# Altium footprint library MyComponents_v2.5.PcbLib: 403 footprints (part 20 of 26)
Each footprint in its own frame and in the unit in brackets; x right, y up, seen from the top. Pads: shape width x height; smd on the part's side, far side on the other; paste and mask are expansions set on the pad; w line width, h text height; cw(c..) or ccw(c..) is an arc to the next point about the centre after c.
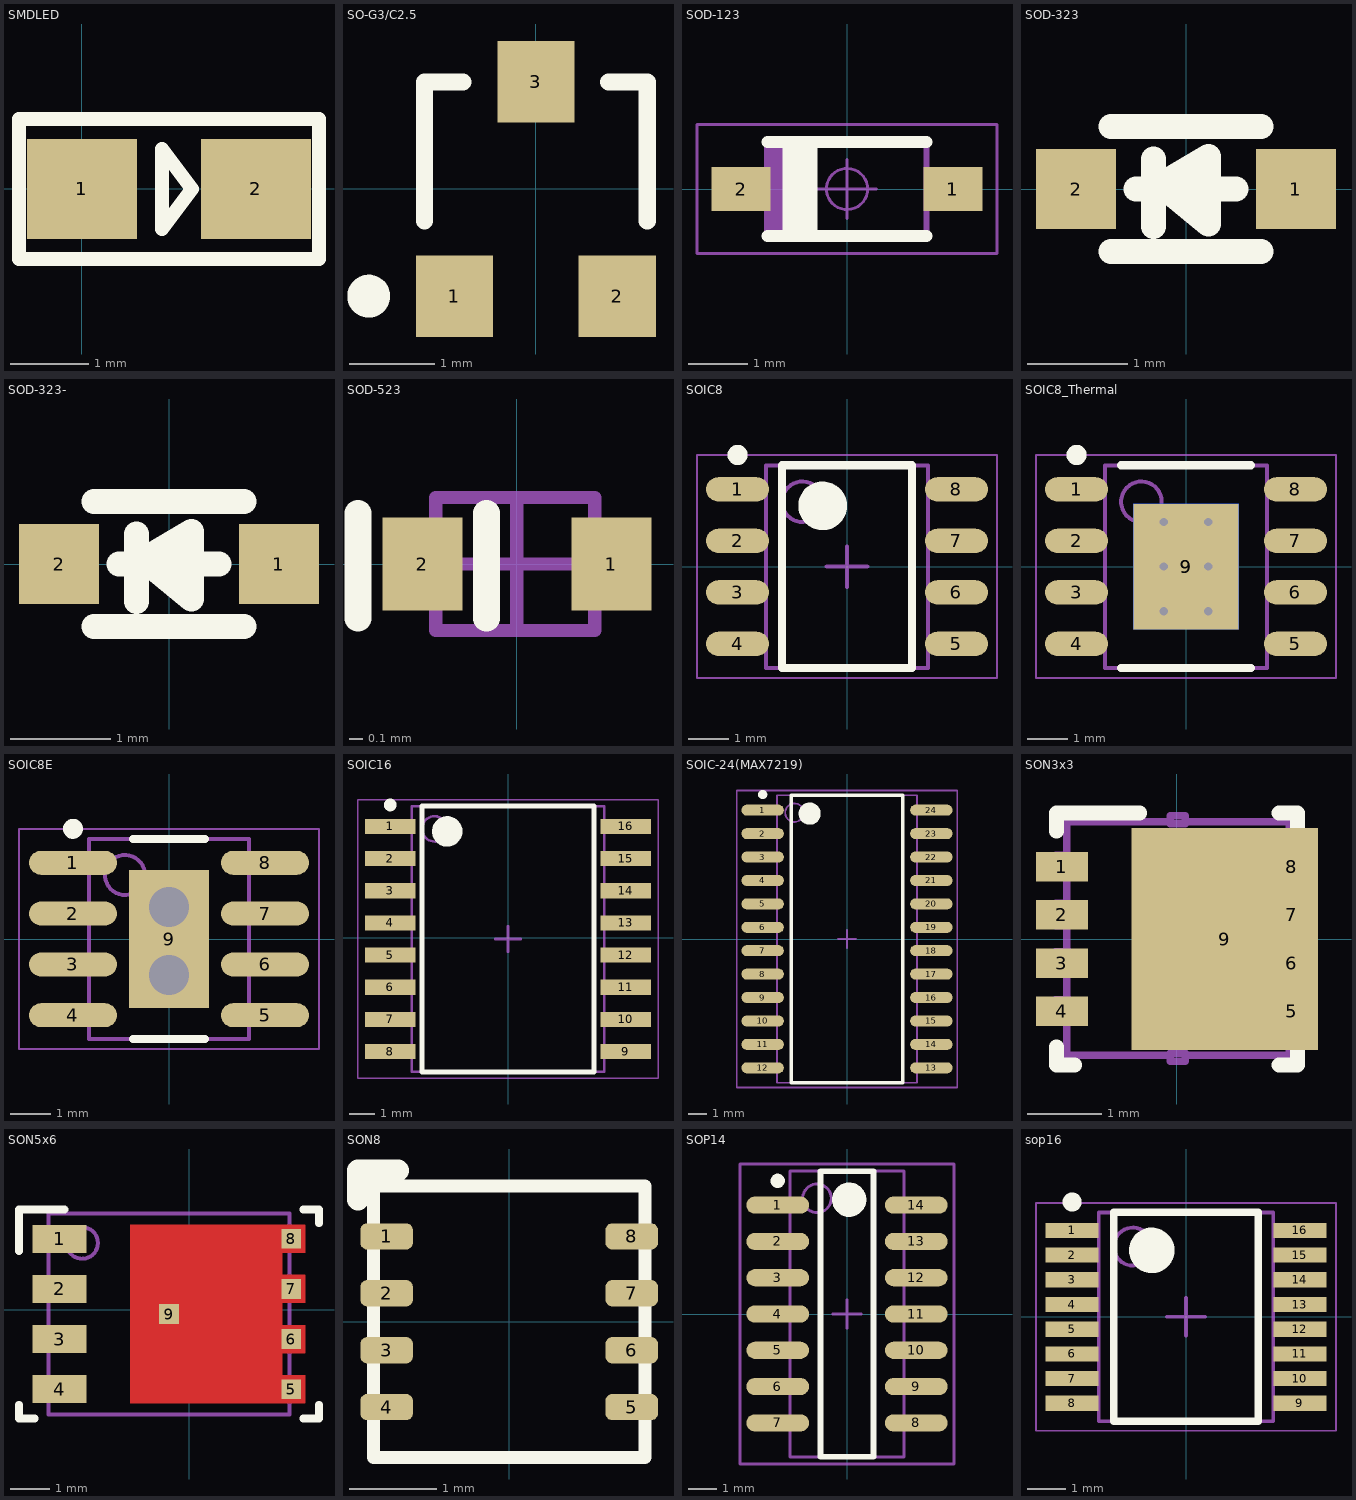
[diagram p19: the footprints below, top view; thin cyan lines are the x and y axes]

## SMDLED [mm]
pads (2):
  rect 1.4x1.27 smd: 1(0.001,-0.002) 2(2.211,-0.002)
Top Overlay:
  lines w0.178: 3.012,0.887 3.011,0.887 ; 3.011,0.887 3.011,-0.891 -0.799,-0.891 -0.799,-0.002 -0.799,0.887 3.011,0.887 ; 1.017,-0.51 1.017,0.506 1.398,-0.002 1.017,-0.51

## SO-G3/C2.5 [mm]
pads (3):
  rect 0.9x0.95 smd: 1(-0.95,-1.25) 2(0.95,-1.25) 3(0,1.25)
Top Overlay:
  circle w0.25: c-1.95,-1.25 r0.125
  lines w0.2: -1.3,-0.375 -1.3,1.25 -0.85,1.25 ; 0.85,1.25 1.3,1.25 1.3,-0.375

## SOD-123 [mm] "MBR0530"
pads (2):
  rect 1x0.75 smd: 1(1.8,0) 2(-1.8,0)
Top Overlay:
  lines w0.2: -1.35,-0.8 1.35,-0.8 ; -1.35,0.8 1.35,0.8 ; -1,-0.8 -1,0.8 ; -0.8,-0.8 -0.8,0.8 ; -0.6,-0.8 -0.6,0.8
Mechanical 15:
  lines w0.1: -1.25,-0.8 -1.25,0.8 ; -1.15,-0.8 -1.15,0.8 ; -1.05,-0.8 -1.05,0.8 ; -0.95,-0.8 -0.95,0.8 ; -0.85,-0.8 -0.85,0.8 ; -0.75,-0.8 -0.75,0.8 ; -0.65,-0.8 -0.65,0.8 ; -1.35,-0.8 -1.35,0.8 1.35,0.8 1.35,-0.8 -1.35,-0.8
  text "1" at 0.45,-0.164 h0.75
Mechanical 16:
  circle w0.05: c0,0 r0.35
  lines w0.001: -1.4,-0.85 -1.4,0.85 1.4,0.85 1.4,-0.85 -1.4,-0.85
  lines w0.05: -0.5,0 0.5,0 ; 0,-0.5 0,0.5 ; -2.55,-1.1 -2.55,1.1 2.55,1.1 2.55,-1.1 -2.55,-1.1

## SOD-323 [mm] "SODFL, 2-Leads, Body 1.30x2.55mm, IPC Medium Density"
height 1.1
pads (2):
  rect 0.8x0.8 smd: 1(1.1,0) 2(-1.1,0)
Top Overlay:
  lines w0.254: -0.75,-0.625 0.75,-0.625 ; -0.75,0.625 0.75,0.625 ; -0.2,0 0.225,-0.35 0.225,0.325 -0.325,0 ; 0.5,0 -0.5,0 -0.325,0 ; -0.325,0 -0.325,0.3 -0.325,-0.375 -0.325,0
3D body "SOD323.step": height 1.1, standoff 0, extent -1.35,-0.549 1.35,0.701

## SOD-323- [mm] "开关二极管2.60mmx1.20mm"
pads (2):
  rect 0.8x0.8 smd: 1(1.1,0) 2(-1.1,0)
Top Overlay:
  lines w0.254: -0.75,-0.625 0.75,-0.625 ; -0.75,0.625 0.75,0.625 ; -0.2,0 0.225,-0.35 0.225,0.325 -0.325,0 ; 0.5,0 -0.5,0 -0.325,0 ; -0.325,0 -0.325,-0.375 -0.325,0.3 -0.325,0
3D body "SOD323.step": height 1.1, standoff 0, extent -1.35,-0.549 1.35,0.701

## SOD-523 [mm] "SODFL, 2-Leads, Body 1.30x2.55mm, IPC Medium Density"
height 1.1
pads (2):
  rect 0.6x0.7 smd: 1(0.71,0) 2(-0.71,0)
Top Overlay:
  lines w0.2: -1.194,-0.406 -1.194,0.381 ; -0.229,-0.406 -0.229,0.381
Mechanical 13:
  lines w0.1: -0.61,-0.5 0.584,-0.5 0.584,0.5 -0.61,0.5 -0.61,-0.5
Mechanical 15:
  lines w0.1: -0.5,0 0.5,0 ; 0,-0.5 0,0.5
3D body "SOD-523.step": height 0.7, standoff 0, extent -0.8,-0.391 0.8,0.406

## SOIC8 [mm] "SOIC, 8-Leads, Body 4.90x3.90mm, Pitch 1.27mm, IPC Medium Density"
height 1.75
pads (8):
  oval 1.55x0.6 smd: 1(-2.7,1.905) 2(-2.7,0.635) 3(-2.7,-0.635) 4(-2.7,-1.905) 5(2.7,-1.905) 6(2.7,-0.635) 7(2.7,0.635) 8(2.7,1.905)
Top Overlay:
  circle w0.6: c-0.6,1.5 r0.3
  circle w0.25: c-2.7,2.755 r0.125
  lines w0.2: -1.6,-2.5 1.6,-2.5 1.6,2.5 -1.6,2.5 -1.6,-2.5
Mechanical 13:
  circle w0.1: c-1.1,1.6 r0.5
  lines w0.1: -2,-2.5 2,-2.5 2,2.5 -2,2.5 -2,-2.5
Mechanical 15:
  lines w0.05: -3.7,-2.75 3.7,-2.75 3.7,2.75 -3.7,2.75 -3.7,-2.75
  lines w0.1: -0.5,0 0.5,0 ; 0,-0.5 0,0.5
3D body "SOIC8.step": height 1.7, standoff 0, extent -3,-2.45 3,2.45

## SOIC8_Thermal [mm] "SOIC, 8-Leads, Body 4.90x3.90mm, Pitch 1.27mm, Thermal Pad 3.10x2.60mm, IPC Medium Density"
height 1.75
pads (10):
  oval 1.55x0.6 smd: 1(-2.7,1.905) 2(-2.7,0.635) 3(-2.7,-0.635) 4(-2.7,-1.905) 5(2.7,-1.905) 6(2.7,-0.635) 7(2.7,0.635) 8(2.7,1.905)
  rect 2.6x3.1 smd: 9(0,0)
  rect 2.6x3.1 smd far side: 9(0,0)
via -0.55,1.1 diameter 0.5 hole 0.2
via 0.55,1.1 diameter 0.5 hole 0.2
via -0.55,0 diameter 0.5 hole 0.2
via 0.55,0 diameter 0.5 hole 0.2
via -0.55,-1.1 diameter 0.5 hole 0.2
via 0.55,-1.1 diameter 0.5 hole 0.2
Top Overlay:
  circle w0.25: c-2.7,2.755 r0.125
  lines w0.2: -1.6,-2.5 1.6,-2.5 ; -1.6,2.5 1.6,2.5
Mechanical 13:
  circle w0.1: c-1.1,1.6 r0.5
  lines w0.1: -2,-2.5 -2,2.5 2,2.5 2,-2.5 -2,-2.5
Mechanical 15:
  lines w0.05: -3.7,-2.75 -3.7,2.75 3.7,2.75 3.7,-2.75 -3.7,-2.75
  lines w0.1: -0.5,0 0.5,0 ; 0,-0.5 0,0.5
3D body "SOIC8.step": height 1.7, standoff 0, extent -3,-2.45 3,2.45

## SOIC8E [mm] "SOIC, 8-Leads, Body 4.90x3.90mm, Pitch 1.27mm, Thermal Pad 3.45.2x2.00.2mm, IPC Medium Density"
height 1.7
pads (9):
  oval 2.2x0.6 smd: 1(-2.4,1.905) 2(-2.4,0.635) 3(-2.4,-0.635) 4(-2.4,-1.905) 5(2.4,-1.905) 6(2.4,-0.635) 7(2.4,0.635) 8(2.4,1.905)
  rect 2x3.45 smd: 9(0,0)
via 0,0.8 diameter 1.5 hole 1
via 0,-0.9 diameter 1.5 hole 1
Top Overlay:
  circle w0.25: c-2.4,2.755 r0.125
  lines w0.2: -0.9,-2.5 0.9,-2.5 ; -0.9,2.5 0.9,2.5
Mechanical 13:
  circle w0.1: c-1.1,1.6 r0.5
  lines w0.1: -2,-2.5 2,-2.5 2,2.5 -2,2.5 -2,-2.5
Mechanical 15:
  lines w0.05: -3.75,-2.75 3.75,-2.75 3.75,2.75 -3.75,2.75 -3.75,-2.75
  lines w0.1: -0.5,0 0.5,0 ; 0,-0.5 0,0.5
3D body "SOIC8.step": height 1.7, standoff 0, extent -3,-2.45 3,2.45

## SOIC16 [mm]
pads (16):
  rect 2x0.6 smd: 1(-4.65,4.394) 2(-4.65,3.124) 3(-4.65,1.854) 4(-4.65,0.584) 5(-4.65,-0.686) 6(-4.65,-1.956) 7(-4.65,-3.226) 8(-4.65,-4.496) 9(4.65,-4.496) 10(4.65,-3.226) 11(4.65,-1.956) 12(4.65,-0.686) 13(4.65,0.584) 14(4.65,1.854) 15(4.65,3.124) 16(4.65,4.394)
Top Overlay:
  circle w0.6: c-2.4,4.199 r0.3
  circle w0.25: c-4.65,5.244 r0.125
  lines w0.2: -3.4,-5.301 3.4,-5.301 3.4,5.199 -3.4,5.199 -3.4,-5.301
Mechanical 13:
  circle w0.1: c-2.9,4.299 r0.5
  lines w0.1: -3.8,-5.301 3.8,-5.301 3.8,5.199 -3.8,5.199 -3.8,-5.301
Mechanical 15:
  lines w0.05: -5.925,-5.551 5.925,-5.551 5.925,5.449 -5.925,5.449 -5.925,-5.551
  lines w0.1: -0.5,-0.051 0.5,-0.051 ; 0,-0.551 0,0.449
3D body: height 2.65, standoff 0.1, extent -3.8,-5.301 3.8,5.199

## SOIC-24(MAX7219) [mm] "SOIC, 24-Leads, Body 15.6x7.6mm (max), Pitch 1.27mm, IPC Medium Density"
height 2.65
pads (24):
  oval 2.3x0.6 smd: 1(-4.575,6.985) 2(-4.575,5.715) 3(-4.575,4.445) 4(-4.575,3.175) 5(-4.575,1.905) 6(-4.575,0.635) 7(-4.575,-0.635) 8(-4.575,-1.905) 9(-4.575,-3.175) 10(-4.575,-4.445) 11(-4.575,-5.715) 12(-4.575,-6.985) 13(4.575,-6.985) 14(4.575,-5.715) 15(4.575,-4.445) 16(4.575,-3.175) 17(4.575,-1.905) 18(4.575,-0.635) 19(4.575,0.635) 20(4.575,1.905) 21(4.575,3.175) 22(4.575,4.445) 23(4.575,5.715) 24(4.575,6.985)
Top Overlay:
  circle w0.25: c-4.575,7.835 r0.125
  circle w0.6: c-2.025,6.8 r0.3
  lines w0.2: -3.025,-7.8 -3.025,7.8 3.025,7.8 3.025,-7.8 -3.025,-7.8
Mechanical 13:
  circle w0.1: c-2.85,6.85 r0.5
  lines w0.1: -3.8,-7.8 -3.8,7.8 3.8,7.8 3.8,-7.8 -3.8,-7.8
Mechanical 15:
  lines w0.1: -0.5,0 0.5,0 ; 0,-0.5 0,0.5 ; -5.975,-8.05 -5.975,8.05 5.975,8.05 5.975,-8.05 -5.975,-8.05
3D body: height 2.65, standoff 0.1, extent -3.8,-7.8 3.8,7.8

## SON3x3 [mm]
pads (9):
  rect 0.7x0.4 smd paste-0.05 mask-0.051: 1(-1.55,0.975) 2(-1.55,0.325) 3(-1.55,-0.325) 4(-1.55,-0.975) 5(1.55,-0.975) 6(1.55,-0.325) 7(1.55,0.325) 8(1.55,0.975)
  rect 2.51x3 smd paste-1.262 mask-1.257: 9(0.645,0)
Top Overlay:
  lines w0.2: -1.625,-1.453 -1.625,-1.7 -1.378,-1.7 ; -1.625,1.453 -1.625,1.7 -0.5,1.7 ; 1.378,-1.7 1.625,-1.7 1.625,-1.453 ; 1.378,1.7 1.625,1.7 1.625,1.453
Top Paste:
  region: 0.144,1.185 0.145,1.176 0.145,0.149 0.144,0.14 0.141,0.13 0.137,0.122 0.131,0.114 0.123,0.108 0.115,0.104 0.105,0.101 0.096,0.1 -0.511,0.1 -0.52,0.101 -0.53,0.104 -0.538,0.108 -0.546,0.114 -0.552,0.122 -0.556,0.13 -0.559,0.14 -0.56,0.149 -0.56,1.176 -0.559,1.185 -0.556,1.195 -0.552,1.203 -0.546,1.211 -0.538,1.217 -0.53,1.221 -0.52,1.224 -0.511,1.225 0.096,1.225 0.105,1.224 0.115,1.221 0.123,1.217 0.131,1.211 0.137,1.203 0.141,1.195
  region: 0.144,-0.14 0.145,-0.149 0.145,-1.176 0.144,-1.185 0.141,-1.195 0.137,-1.203 0.131,-1.211 0.123,-1.217 0.115,-1.221 0.105,-1.224 0.096,-1.225 -0.511,-1.225 -0.52,-1.224 -0.53,-1.221 -0.538,-1.217 -0.546,-1.211 -0.552,-1.203 -0.556,-1.195 -0.559,-1.185 -0.56,-1.176 -0.56,-0.149 -0.559,-0.14 -0.556,-0.13 -0.552,-0.122 -0.546,-0.114 -0.538,-0.108 -0.53,-0.104 -0.52,-0.101 -0.511,-0.1 0.096,-0.1 0.105,-0.101 0.115,-0.104 0.123,-0.108 0.131,-0.114 0.137,-0.122 0.141,-0.13
  region: 0.346,-1.185 0.345,-1.176 0.345,-0.149 0.346,-0.14 0.349,-0.13 0.353,-0.122 0.359,-0.114 0.367,-0.108 0.375,-0.104 0.385,-0.101 0.394,-0.1 1.001,-0.1 1.01,-0.101 1.02,-0.104 1.028,-0.108 1.036,-0.114 1.042,-0.122 1.046,-0.13 1.049,-0.14 1.05,-0.149 1.05,-1.176 1.049,-1.185 1.046,-1.195 1.042,-1.203 1.036,-1.211 1.028,-1.217 1.02,-1.221 1.01,-1.224 1.001,-1.225 0.394,-1.225 0.385,-1.224 0.375,-1.221 0.367,-1.217 0.359,-1.211 0.353,-1.203 0.349,-1.195
  region: 0.346,0.14 0.345,0.149 0.345,1.176 0.346,1.185 0.349,1.195 0.353,1.203 0.359,1.211 0.367,1.217 0.375,1.221 0.385,1.224 0.394,1.225 1.001,1.225 1.01,1.224 1.02,1.221 1.028,1.217 1.036,1.211 1.042,1.203 1.046,1.195 1.049,1.185 1.05,1.176 1.05,0.149 1.049,0.14 1.046,0.13 1.042,0.122 1.036,0.114 1.028,0.108 1.02,0.104 1.01,0.101 1.001,0.1 0.394,0.1 0.385,0.101 0.375,0.104 0.367,0.108 0.359,0.114 0.353,0.122 0.349,0.13
Top Solder:
  region: 0.925,1.125 0.925,0.825 1.425,0.825 1.425,1.125
  region: 0.925,-0.825 0.925,-1.125 1.425,-1.125 1.425,-0.825
  region: 0.925,-0.175 0.925,-0.475 1.425,-0.475 1.425,-0.175
  region: 0.925,0.475 0.925,0.175 1.425,0.175 1.425,0.475
  region: -0.559,-1.182 -0.56,-1.172 -0.56,1.172 -0.559,1.182 -0.556,1.192 -0.551,1.201 -0.544,1.209 -0.536,1.216 -0.527,1.221 -0.517,1.224 -0.507,1.225 1.162,1.225 1.172,1.224 1.182,1.221 1.191,1.216 1.199,1.209 1.206,1.201 1.211,1.192 1.214,1.182 1.215,1.172 1.215,-1.172 1.214,-1.182 1.211,-1.192 1.206,-1.201 1.199,-1.209 1.191,-1.216 1.182,-1.221 1.172,-1.224 1.162,-1.225 -0.507,-1.225 -0.517,-1.224 -0.527,-1.221 -0.536,-1.216 -0.544,-1.209 -0.551,-1.201 -0.556,-1.192
Mechanical 13:
  lines w0.1: -1.487,-1.119 -1.487,-1.569 -0.087,-1.569 ; -1.487,-0.819 -1.487,-0.469 ; -1.487,-0.169 -1.487,0.181 ; -1.487,0.481 -1.487,0.831 ; -1.487,1.131 -1.487,1.581 -0.087,1.581 ; 0.113,-1.569 1.513,-1.569 1.513,-1.119 ; 0.113,1.581 1.513,1.581 1.513,1.131 ; 1.513,-0.819 1.513,-0.469 ; 1.513,-0.169 1.513,0.181 ; 1.513,0.481 1.513,0.831 ; -1.637,-1.119 -1.461,-1.119 -1.461,-0.819 -1.637,-0.819 -1.637,-1.119 ; -1.637,-0.469 -1.461,-0.469 -1.461,-0.169 -1.637,-0.169 -1.637,-0.469 ; -1.637,0.181 -1.637,0.481 -1.461,0.481 -1.461,0.181 -1.637,0.181 ; -1.637,0.831 -1.461,0.831 -1.461,1.131 -1.637,1.131 -1.637,0.831 ; -0.087,-1.649 0.113,-1.649 0.113,-1.543 -0.087,-1.543 -0.087,-1.649 ; -0.087,1.554 -0.087,1.661 0.113,1.661 0.113,1.554 -0.087,1.554 ; 1.486,-1.119 1.663,-1.119 1.663,-0.819 1.486,-0.819 1.486,-1.119 ; 1.486,-0.469 1.663,-0.469 1.663,-0.169 1.486,-0.169 1.486,-0.469 ; 1.486,0.181 1.663,0.181 1.663,0.481 1.486,0.481 1.486,0.181 ; 1.486,0.831 1.663,0.831 1.663,1.131 1.486,1.131 1.486,0.831
3D body "SON3x3.stp": height 0.9, standoff 0, extent -1.65,-1.655 1.65,1.655

## SON5x6 [mm] "5x6mm MOS"
pads (9):
  rect 1.372x0.71 smd paste-0.673 mask+0.051: 1(-3.278,1.803) 2(-3.278,0.533) 3(-3.278,-0.737) 4(-3.278,-2.007)
  rect 0.5x0.5 smd paste-0.237 mask+0.051: 5(2.592,-2.007) 6(2.592,-0.737) 7(2.592,0.533) 8(2.592,1.803) 9(-0.508,-0.102)
Top Layer:
  region: -1.492,2.158 -1.492,-2.362 2.948,-2.362 2.948,-1.652 2.358,-1.652 2.358,-1.092 2.948,-1.092 2.948,-0.382 2.358,-0.382 2.358,0.178 2.948,0.178 2.948,0.888 2.358,0.888 2.358,1.448 2.948,1.448 2.948,2.158
Top Overlay:
  lines w0.2: -4.308,-2.402 -4.308,-2.752 -3.908,-2.752 ; -4.308,1.498 -4.308,2.548 -3.158,2.548 ; 2.892,-2.752 3.292,-2.752 3.292,-2.402 ; 2.892,2.548 3.292,2.548 3.292,2.198
Top Paste:
  region: -3.801,2.084 -3.801,1.522 -2.729,1.522 -2.729,2.084
  region: -3.801,0.814 -3.801,0.252 -2.729,0.252 -2.729,0.814
  region: -3.801,-0.456 -3.801,-1.018 -2.729,-1.018 -2.729,-0.456
  region: -3.801,-1.726 -3.801,-2.288 -2.729,-2.288 -2.729,-1.726
  region: 0.44,1.84 0.44,1.094 1.734,1.094 1.734,1.84
  region: 0.44,0.794 0.44,0.048 1.734,0.048 1.734,0.794
  region: 0.44,-0.252 0.44,-0.998 1.734,-0.998 1.734,-0.252
  region: 0.44,-1.298 0.44,-2.044 1.734,-2.044 1.734,-1.298
  region: -1.204,-1.298 -1.204,-2.044 0.09,-2.044 0.09,-1.298
  region: -1.204,-0.252 -1.204,-0.998 0.09,-0.998 0.09,-0.252
  region: -1.204,0.794 -1.204,0.048 0.09,0.048 0.09,0.794
  region: -1.204,1.84 -1.204,1.094 0.09,1.094 0.09,1.84
  region: 2.019,0.787 2.019,0.279 2.785,0.279 2.785,0.787
  region: 2.019,2.057 2.019,1.549 2.785,1.549 2.785,2.057
  region: 2.019,-1.753 2.019,-2.261 2.785,-2.261 2.785,-1.753
  region: 2.019,-0.483 2.019,-0.991 2.785,-0.991 2.785,-0.483
Top Solder:
  region: -1.542,-2.372 -1.543,-2.362 -1.543,2.158 -1.542,2.168 -1.539,2.178 -1.534,2.187 -1.528,2.194 -1.52,2.201 -1.511,2.205 -1.502,2.208 -1.492,2.209 2.948,2.209 2.958,2.208 2.967,2.205 2.976,2.201 2.984,2.194 2.99,2.187 2.995,2.178 2.998,2.168 2.999,2.158 2.999,1.448 2.998,1.438 2.995,1.429 2.99,1.42 2.984,1.412 2.976,1.406 2.967,1.401 2.958,1.399 2.948,1.398 2.409,1.398 2.409,0.939 2.948,0.939 2.958,0.938 2.967,0.935 2.976,0.931 2.984,0.924 2.99,0.917 2.995,0.908 2.998,0.898 2.999,0.888 2.999,0.178 2.998,0.168 2.995,0.159 2.99,0.15 2.984,0.142 2.976,0.136 2.967,0.131 2.958,0.129 2.948,0.128 2.409,0.128 2.409,-0.331 2.948,-0.331 2.958,-0.332 2.967,-0.335 2.976,-0.339 2.984,-0.346 2.99,-0.353 2.995,-0.362 2.998,-0.372 2.999,-0.382 2.999,-1.092 2.998,-1.102 2.995,-1.111 2.99,-1.12 2.984,-1.128 2.976,-1.134 2.967,-1.139 2.958,-1.141 2.948,-1.142 2.409,-1.142 2.409,-1.601 2.948,-1.601 2.958,-1.602 2.967,-1.605 2.976,-1.609 2.984,-1.616 2.99,-1.623 2.995,-1.632 2.998,-1.642 2.999,-1.652 2.999,-2.362 2.998,-2.372 2.995,-2.381 2.99,-2.39 2.984,-2.398 2.976,-2.404 2.967,-2.409 2.958,-2.411 2.948,-2.412 -1.492,-2.412 -1.502,-2.411 -1.511,-2.409 -1.52,-2.404 -1.528,-2.398 -1.534,-2.39 -1.539,-2.381
Mechanical 13:
  circle w0.1: c-2.708,1.698 r0.4
  lines w0.1: -3.558,-2.652 -3.558,2.448 2.542,2.448 2.542,-2.652 -3.558,-2.652
3D body "SON5X6.step": height 1.1, standoff 0, extent -3.625,-2.725 2.525,2.425

## SON8 [mm]
pads (8):
  rrect50% 0.6x0.3 smd: 1(-1.4,0.975) 2(-1.4,0.325) 3(-1.4,-0.325) 4(-1.4,-0.975) 5(1.4,-0.975) 6(1.4,-0.325) 7(1.4,0.325) 8(1.4,0.975)
Top Overlay:
  lines w0.15: -1.55,-1.55 1.55,-1.55 1.55,1.55 -1.55,1.55 -1.55,-1.55
  lines w0.254: -1.727,1.397 -1.727,1.727 -1.27,1.727
3D body "SON8.step": height 1, standoff 0, extent -1.575,-1.575 1.575,1.575

## SOP14 [mm] "74HC165"
height 1.75
pads (14):
  oval 2.2x0.6 smd: 1(-2.425,3.81) 2(-2.425,2.54) 3(-2.425,1.27) 4(-2.425,0) 5(-2.425,-1.27) 6(-2.425,-2.54) 7(-2.425,-3.81) 8(2.425,-3.81) 9(2.425,-2.54) 10(2.425,-1.27) 11(2.425,0) 12(2.425,1.27) 13(2.425,2.54) 14(2.425,3.81)
Top Overlay:
  circle w0.25: c-2.425,4.66 r0.125
  circle w0.6: c0.075,4 r0.3
  lines w0.2: -0.925,-5 -0.925,5 0.925,5 0.925,-5 -0.925,-5
Mechanical 13:
  circle w0.1: c-1.05,4.05 r0.5
  lines w0.1: -2,-5 -2,5 2,5 2,-5 -2,-5
Mechanical 15:
  lines w0.1: -0.5,0 0.5,0 ; 0,-0.5 0,0.5 ; -3.75,-5.25 -3.75,5.25 3.75,5.25 3.75,-5.25 -3.75,-5.25
3D body: height 1.75, standoff 0.25, extent -2,-5 2,5

## sop16 [mm] "TSOP, 16-Leads, Body 5.50x4.40mm, Pitch 0.65mm, IPC Medium Density"
height 1.6
pads (16):
  rect 1.4x0.4 smd: 1(-3,2.275) 2(-3,1.625) 3(-3,0.975) 4(-3,0.325) 5(-3,-0.325) 6(-3,-0.975) 7(-3,-1.625) 8(-3,-2.275) 9(3,-2.275) 10(3,-1.625) 11(3,-0.975) 12(3,-0.325) 13(3,0.325) 14(3,0.975) 15(3,1.625) 16(3,2.275)
Top Overlay:
  circle w0.25: c-3,3.025 r0.125
  circle w0.6: c-0.9,1.75 r0.3
  lines w0.2: -1.9,-2.75 -1.9,2.75 1.9,2.75 1.9,-2.75 -1.9,-2.75
Mechanical 13:
  circle w0.1: c-1.4,1.85 r0.5
  lines w0.1: -2.3,-2.75 -2.3,2.75 2.3,2.75 2.3,-2.75 -2.3,-2.75
Mechanical 15:
  lines w0.05: -3.95,-3 -3.95,3 3.95,3 3.95,-3 -3.95,-3
  lines w0.1: -0.5,0 0.5,0 ; 0,-0.5 0,0.5
3D body: height 1.6, standoff 0.1, extent -2.3,-2.75 2.3,2.75